# Altium integrated library Weidmueller_OMNIMATE_Power.IntLib: 508 symbols (part 7 of 9)
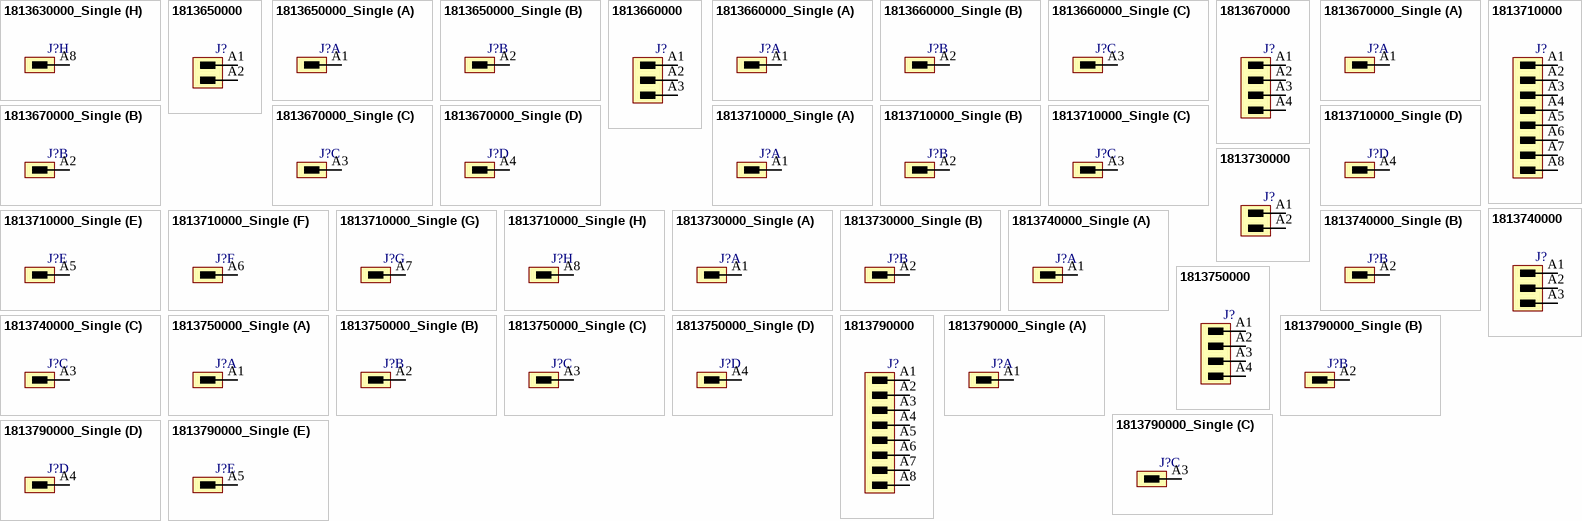
[diagram p37: symbols 1813630000_Single to 1813790000_Single]

## 1813650000_Single
designator J?
OMNIMATE Power - series BU/SU 10.16HP; PartNumber: 1813650000; Manufacturer: Weidmueller; Short_text_for_material: SU 10.16HP/02/180F 3.5AG BK BX; Side_termination_characteristic: Clip-on flange; Mounting_onto_the_PCB: Solder connection; Pitch_mm: 10.16 mm; Pitch_inch: 0.4 inch; No_of_poles: 2; Outgoing_elbow: 180°; Solder_pin_length_mm: 3.5 mm; Contact_material: Cu-Leg; Contact_surface: silver-plated; Insulating_material: PBT GF; UL_94_flammability_rating: V-0; Rated_voltage_for_surge_voltage_class_pollution_degree_II_2: 1000 V; Rated_current_min_no_of_poles_TU_20_deg_C: 19 A; Rated_voltage_use_group_B_UL_1059: 300 V; Rated_current_use_group_B_UL_1059: 54 A; PackageReference: SU_10_16HP_180F_02; Colour: Black; Packaging: Box; Qty: 50 PCS; Revision: V1; ComponentLink1Description: Manufacturer URL; ComponentLink1URL: http://www.weidmueller.com/; ComponentLink2Description: URL Link1; ComponentLink2URL: http://catalog.weidmueller.com/catalog/Start.do?localeId=en&ObjectID=1813650000
footprint SU_10_16HP_180F_02 (OMNIMATE Power - Serie BU/SU 10.16HP  SU 10.16HP/02/180F 3.5)
part A pins: A1
part B pins: A2

## 1813660000
designator J?
OMNIMATE Power - series BU/SU 10.16HP; PartNumber: 1813660000; Manufacturer: Weidmueller; Short_text_for_material: SU 10.16HP/03/180F 3.5AG BK BX; Side_termination_characteristic: Clip-on flange; Mounting_onto_the_PCB: Solder connection; Pitch_mm: 10.16 mm; Pitch_inch: 0.4 inch; No_of_poles: 3; Outgoing_elbow: 180°; Solder_pin_length_mm: 3.5 mm; Contact_material: Cu-Leg; Contact_surface: silver-plated; Insulating_material: PBT GF; UL_94_flammability_rating: V-0; Rated_voltage_for_surge_voltage_class_pollution_degree_II_2: 1000 V; Rated_current_min_no_of_poles_TU_20_deg_C: 19 A; Rated_voltage_use_group_B_UL_1059: 300 V; Rated_current_use_group_B_UL_1059: 54 A; PackageReference: SU_10_16HP_180F_03; Colour: Black; Packaging: Box; Qty: 50 PCS; Revision: V1; ComponentLink1Description: Manufacturer URL; ComponentLink1URL: http://www.weidmueller.com/; ComponentLink2Description: URL Link1; ComponentLink2URL: http://catalog.weidmueller.com/catalog/Start.do?localeId=en&ObjectID=1813660000
footprint SU_10_16HP_180F_03 (OMNIMATE Power - Serie BU/SU 10.16HP  SU 10.16HP/03/180F 3.5)
pins: A1, A2, A3

## 1813660000_Single
designator J?
OMNIMATE Power - series BU/SU 10.16HP; PartNumber: 1813660000; Manufacturer: Weidmueller; Short_text_for_material: SU 10.16HP/03/180F 3.5AG BK BX; Side_termination_characteristic: Clip-on flange; Mounting_onto_the_PCB: Solder connection; Pitch_mm: 10.16 mm; Pitch_inch: 0.4 inch; No_of_poles: 3; Outgoing_elbow: 180°; Solder_pin_length_mm: 3.5 mm; Contact_material: Cu-Leg; Contact_surface: silver-plated; Insulating_material: PBT GF; UL_94_flammability_rating: V-0; Rated_voltage_for_surge_voltage_class_pollution_degree_II_2: 1000 V; Rated_current_min_no_of_poles_TU_20_deg_C: 19 A; Rated_voltage_use_group_B_UL_1059: 300 V; Rated_current_use_group_B_UL_1059: 54 A; PackageReference: SU_10_16HP_180F_03; Colour: Black; Packaging: Box; Qty: 50 PCS; Revision: V1; ComponentLink1Description: Manufacturer URL; ComponentLink1URL: http://www.weidmueller.com/; ComponentLink2Description: URL Link1; ComponentLink2URL: http://catalog.weidmueller.com/catalog/Start.do?localeId=en&ObjectID=1813660000
footprint SU_10_16HP_180F_03 (OMNIMATE Power - Serie BU/SU 10.16HP  SU 10.16HP/03/180F 3.5)
part A pins: A1
part B pins: A2
part C pins: A3

## 1813670000
designator J?
OMNIMATE Power - series BU/SU 10.16HP; PartNumber: 1813670000; Manufacturer: Weidmueller; Short_text_for_material: SU 10.16HP/04/180F 3.5AG BK BX; Side_termination_characteristic: Clip-on flange; Mounting_onto_the_PCB: Solder connection; Pitch_mm: 10.16 mm; Pitch_inch: 0.4 inch; No_of_poles: 4; Outgoing_elbow: 180°; Solder_pin_length_mm: 3.5 mm; Contact_material: Cu-Leg; Contact_surface: silver-plated; Insulating_material: PBT GF; UL_94_flammability_rating: V-0; Rated_voltage_for_surge_voltage_class_pollution_degree_II_2: 1000 V; Rated_current_min_no_of_poles_TU_20_deg_C: 19 A; Rated_voltage_use_group_B_UL_1059: 300 V; Rated_current_use_group_B_UL_1059: 54 A; PackageReference: SU_10_16HP_180F_04; Colour: Black; Packaging: Box; Qty: 50 PCS; Revision: V1; ComponentLink1Description: Manufacturer URL; ComponentLink1URL: http://www.weidmueller.com/; ComponentLink2Description: URL Link1; ComponentLink2URL: http://catalog.weidmueller.com/catalog/Start.do?localeId=en&ObjectID=1813670000
footprint SU_10_16HP_180F_04 (OMNIMATE Power - Serie BU/SU 10.16HP  SU 10.16HP/04/180F 3.5)
pins: A1, A2, A3, A4

## 1813670000_Single
designator J?
OMNIMATE Power - series BU/SU 10.16HP; PartNumber: 1813670000; Manufacturer: Weidmueller; Short_text_for_material: SU 10.16HP/04/180F 3.5AG BK BX; Side_termination_characteristic: Clip-on flange; Mounting_onto_the_PCB: Solder connection; Pitch_mm: 10.16 mm; Pitch_inch: 0.4 inch; No_of_poles: 4; Outgoing_elbow: 180°; Solder_pin_length_mm: 3.5 mm; Contact_material: Cu-Leg; Contact_surface: silver-plated; Insulating_material: PBT GF; UL_94_flammability_rating: V-0; Rated_voltage_for_surge_voltage_class_pollution_degree_II_2: 1000 V; Rated_current_min_no_of_poles_TU_20_deg_C: 19 A; Rated_voltage_use_group_B_UL_1059: 300 V; Rated_current_use_group_B_UL_1059: 54 A; PackageReference: SU_10_16HP_180F_04; Colour: Black; Packaging: Box; Qty: 50 PCS; Revision: V1; ComponentLink1Description: Manufacturer URL; ComponentLink1URL: http://www.weidmueller.com/; ComponentLink2Description: URL Link1; ComponentLink2URL: http://catalog.weidmueller.com/catalog/Start.do?localeId=en&ObjectID=1813670000
footprint SU_10_16HP_180F_04 (OMNIMATE Power - Serie BU/SU 10.16HP  SU 10.16HP/04/180F 3.5)
part A pins: A1
part B pins: A2
part C pins: A3
part D pins: A4

## 1813710000
designator J?
OMNIMATE Power - series BU/SU 10.16HP; PartNumber: 1813710000; Manufacturer: Weidmueller; Short_text_for_material: SU 10.16HP/08/180F 3.5AG BK BX; Side_termination_characteristic: Clip-on flange; Mounting_onto_the_PCB: Solder connection; Pitch_mm: 10.16 mm; Pitch_inch: 0.4 inch; No_of_poles: 8; Outgoing_elbow: 180°; Solder_pin_length_mm: 3.5 mm; Contact_material: Cu-Leg; Contact_surface: silver-plated; Insulating_material: PBT GF; UL_94_flammability_rating: V-0; Rated_voltage_for_surge_voltage_class_pollution_degree_II_2: 1000 V; Rated_current_min_no_of_poles_TU_20_deg_C: 19 A; Rated_voltage_use_group_B_UL_1059: 300 V; Rated_current_use_group_B_UL_1059: 54 A; PackageReference: SU_10_16HP_180F_08; Colour: Black; Packaging: Box; Qty: 20 PCS; Revision: V1; ComponentLink1Description: Manufacturer URL; ComponentLink1URL: http://www.weidmueller.com/; ComponentLink2Description: URL Link1; ComponentLink2URL: http://catalog.weidmueller.com/catalog/Start.do?localeId=en&ObjectID=1813710000
footprint SU_10_16HP_180F_08 (OMNIMATE Power - Serie BU/SU 10.16HP  SU 10.16HP/08/180F 3.5)
pins: A1, A2, A3, A4, A5, A6, A7, A8

## 1813710000_Single
designator J?
OMNIMATE Power - series BU/SU 10.16HP; PartNumber: 1813710000; Manufacturer: Weidmueller; Short_text_for_material: SU 10.16HP/08/180F 3.5AG BK BX; Side_termination_characteristic: Clip-on flange; Mounting_onto_the_PCB: Solder connection; Pitch_mm: 10.16 mm; Pitch_inch: 0.4 inch; No_of_poles: 8; Outgoing_elbow: 180°; Solder_pin_length_mm: 3.5 mm; Contact_material: Cu-Leg; Contact_surface: silver-plated; Insulating_material: PBT GF; UL_94_flammability_rating: V-0; Rated_voltage_for_surge_voltage_class_pollution_degree_II_2: 1000 V; Rated_current_min_no_of_poles_TU_20_deg_C: 19 A; Rated_voltage_use_group_B_UL_1059: 300 V; Rated_current_use_group_B_UL_1059: 54 A; PackageReference: SU_10_16HP_180F_08; Colour: Black; Packaging: Box; Qty: 20 PCS; Revision: V1; ComponentLink1Description: Manufacturer URL; ComponentLink1URL: http://www.weidmueller.com/; ComponentLink2Description: URL Link1; ComponentLink2URL: http://catalog.weidmueller.com/catalog/Start.do?localeId=en&ObjectID=1813710000
footprint SU_10_16HP_180F_08 (OMNIMATE Power - Serie BU/SU 10.16HP  SU 10.16HP/08/180F 3.5)
part A pins: A1
part B pins: A2
part C pins: A3
part D pins: A4
part E pins: A5
part F pins: A6
part G pins: A7
part H pins: A8

## 1813730000
designator J?
OMNIMATE Power - series BU/SU 10.16HP; PartNumber: 1813730000; Manufacturer: Weidmueller; Short_text_for_material: SU 10.16HP/02/270F 3.5AG BK BX; Side_termination_characteristic: Clip-on flange; Mounting_onto_the_PCB: Solder connection; Pitch_mm: 10.16 mm; Pitch_inch: 0.4 inch; No_of_poles: 2; Outgoing_elbow: 270°; Solder_pin_length_mm: 3.5 mm; Contact_material: Cu-Leg; Contact_surface: silver-plated; Insulating_material: PBT GF; UL_94_flammability_rating: V-0; Rated_voltage_for_surge_voltage_class_pollution_degree_II_2: 1000 V; Rated_current_min_no_of_poles_TU_20_deg_C: 19 A; Rated_voltage_use_group_B_UL_1059: 300 V; Rated_current_use_group_B_UL_1059: 54 A; PackageReference: SU_10_16HP_270F_02; Colour: Black; Packaging: Box; Qty: 50 PCS; Revision: V1; ComponentLink1Description: Manufacturer URL; ComponentLink1URL: http://www.weidmueller.com/; ComponentLink2Description: URL Link1; ComponentLink2URL: http://catalog.weidmueller.com/catalog/Start.do?localeId=en&ObjectID=1813730000
footprint SU_10_16HP_270F_02 (OMNIMATE Power - Serie BU/SU 10.16HP  SU 10.16HP/02/270F 3.5)
pins: A1, A2

## 1813730000_Single
designator J?
OMNIMATE Power - series BU/SU 10.16HP; PartNumber: 1813730000; Manufacturer: Weidmueller; Short_text_for_material: SU 10.16HP/02/270F 3.5AG BK BX; Side_termination_characteristic: Clip-on flange; Mounting_onto_the_PCB: Solder connection; Pitch_mm: 10.16 mm; Pitch_inch: 0.4 inch; No_of_poles: 2; Outgoing_elbow: 270°; Solder_pin_length_mm: 3.5 mm; Contact_material: Cu-Leg; Contact_surface: silver-plated; Insulating_material: PBT GF; UL_94_flammability_rating: V-0; Rated_voltage_for_surge_voltage_class_pollution_degree_II_2: 1000 V; Rated_current_min_no_of_poles_TU_20_deg_C: 19 A; Rated_voltage_use_group_B_UL_1059: 300 V; Rated_current_use_group_B_UL_1059: 54 A; PackageReference: SU_10_16HP_270F_02; Colour: Black; Packaging: Box; Qty: 50 PCS; Revision: V1; ComponentLink1Description: Manufacturer URL; ComponentLink1URL: http://www.weidmueller.com/; ComponentLink2Description: URL Link1; ComponentLink2URL: http://catalog.weidmueller.com/catalog/Start.do?localeId=en&ObjectID=1813730000
footprint SU_10_16HP_270F_02 (OMNIMATE Power - Serie BU/SU 10.16HP  SU 10.16HP/02/270F 3.5)
part A pins: A1
part B pins: A2

## 1813740000
designator J?
OMNIMATE Power - series BU/SU 10.16HP; PartNumber: 1813740000; Manufacturer: Weidmueller; Short_text_for_material: SU 10.16HP/03/270F 3.5AG BK BX; Side_termination_characteristic: Clip-on flange; Mounting_onto_the_PCB: Solder connection; Pitch_mm: 10.16 mm; Pitch_inch: 0.4 inch; No_of_poles: 3; Outgoing_elbow: 270°; Solder_pin_length_mm: 3.5 mm; Contact_material: Cu-Leg; Contact_surface: silver-plated; Insulating_material: PBT GF; UL_94_flammability_rating: V-0; Rated_voltage_for_surge_voltage_class_pollution_degree_II_2: 1000 V; Rated_current_min_no_of_poles_TU_20_deg_C: 19 A; Rated_voltage_use_group_B_UL_1059: 300 V; Rated_current_use_group_B_UL_1059: 54 A; PackageReference: SU_10_16HP_270F_03; Colour: Black; Packaging: Box; Qty: 50 PCS; Revision: V1; ComponentLink1Description: Manufacturer URL; ComponentLink1URL: http://www.weidmueller.com/; ComponentLink2Description: URL Link1; ComponentLink2URL: http://catalog.weidmueller.com/catalog/Start.do?localeId=en&ObjectID=1813740000
footprint SU_10_16HP_270F_03 (OMNIMATE Power - Serie BU/SU 10.16HP  SU 10.16HP/03/270F 3.5)
pins: A1, A2, A3

## 1813740000_Single
designator J?
OMNIMATE Power - series BU/SU 10.16HP; PartNumber: 1813740000; Manufacturer: Weidmueller; Short_text_for_material: SU 10.16HP/03/270F 3.5AG BK BX; Side_termination_characteristic: Clip-on flange; Mounting_onto_the_PCB: Solder connection; Pitch_mm: 10.16 mm; Pitch_inch: 0.4 inch; No_of_poles: 3; Outgoing_elbow: 270°; Solder_pin_length_mm: 3.5 mm; Contact_material: Cu-Leg; Contact_surface: silver-plated; Insulating_material: PBT GF; UL_94_flammability_rating: V-0; Rated_voltage_for_surge_voltage_class_pollution_degree_II_2: 1000 V; Rated_current_min_no_of_poles_TU_20_deg_C: 19 A; Rated_voltage_use_group_B_UL_1059: 300 V; Rated_current_use_group_B_UL_1059: 54 A; PackageReference: SU_10_16HP_270F_03; Colour: Black; Packaging: Box; Qty: 50 PCS; Revision: V1; ComponentLink1Description: Manufacturer URL; ComponentLink1URL: http://www.weidmueller.com/; ComponentLink2Description: URL Link1; ComponentLink2URL: http://catalog.weidmueller.com/catalog/Start.do?localeId=en&ObjectID=1813740000
footprint SU_10_16HP_270F_03 (OMNIMATE Power - Serie BU/SU 10.16HP  SU 10.16HP/03/270F 3.5)
part A pins: A1
part B pins: A2
part C pins: A3

## 1813750000
designator J?
OMNIMATE Power - series BU/SU 10.16HP; PartNumber: 1813750000; Manufacturer: Weidmueller; Short_text_for_material: SU 10.16HP/04/270F 3.5AG BK BX; Side_termination_characteristic: Clip-on flange; Mounting_onto_the_PCB: Solder connection; Pitch_mm: 10.16 mm; Pitch_inch: 0.4 inch; No_of_poles: 4; Outgoing_elbow: 270°; Solder_pin_length_mm: 3.5 mm; Contact_material: Cu-Leg; Contact_surface: silver-plated; Insulating_material: PBT GF; UL_94_flammability_rating: V-0; Rated_voltage_for_surge_voltage_class_pollution_degree_II_2: 1000 V; Rated_current_min_no_of_poles_TU_20_deg_C: 19 A; Rated_voltage_use_group_B_UL_1059: 300 V; Rated_current_use_group_B_UL_1059: 54 A; PackageReference: SU_10_16HP_270F_04; Colour: Black; Packaging: Box; Qty: 50 PCS; Revision: V1; ComponentLink1Description: Manufacturer URL; ComponentLink1URL: http://www.weidmueller.com/; ComponentLink2Description: URL Link1; ComponentLink2URL: http://catalog.weidmueller.com/catalog/Start.do?localeId=en&ObjectID=1813750000
footprint SU_10_16HP_270F_04 (OMNIMATE Power - Serie BU/SU 10.16HP  SU 10.16HP/04/270F 3.5)
pins: A1, A2, A3, A4

## 1813750000_Single
designator J?
OMNIMATE Power - series BU/SU 10.16HP; PartNumber: 1813750000; Manufacturer: Weidmueller; Short_text_for_material: SU 10.16HP/04/270F 3.5AG BK BX; Side_termination_characteristic: Clip-on flange; Mounting_onto_the_PCB: Solder connection; Pitch_mm: 10.16 mm; Pitch_inch: 0.4 inch; No_of_poles: 4; Outgoing_elbow: 270°; Solder_pin_length_mm: 3.5 mm; Contact_material: Cu-Leg; Contact_surface: silver-plated; Insulating_material: PBT GF; UL_94_flammability_rating: V-0; Rated_voltage_for_surge_voltage_class_pollution_degree_II_2: 1000 V; Rated_current_min_no_of_poles_TU_20_deg_C: 19 A; Rated_voltage_use_group_B_UL_1059: 300 V; Rated_current_use_group_B_UL_1059: 54 A; PackageReference: SU_10_16HP_270F_04; Colour: Black; Packaging: Box; Qty: 50 PCS; Revision: V1; ComponentLink1Description: Manufacturer URL; ComponentLink1URL: http://www.weidmueller.com/; ComponentLink2Description: URL Link1; ComponentLink2URL: http://catalog.weidmueller.com/catalog/Start.do?localeId=en&ObjectID=1813750000
footprint SU_10_16HP_270F_04 (OMNIMATE Power - Serie BU/SU 10.16HP  SU 10.16HP/04/270F 3.5)
part A pins: A1
part B pins: A2
part C pins: A3
part D pins: A4

## 1813790000
designator J?
OMNIMATE Power - series BU/SU 10.16HP; PartNumber: 1813790000; Manufacturer: Weidmueller; Short_text_for_material: SU 10.16HP/08/270F 3.5AG BK BX; Side_termination_characteristic: Clip-on flange; Mounting_onto_the_PCB: Solder connection; Pitch_mm: 10.16 mm; Pitch_inch: 0.4 inch; No_of_poles: 8; Outgoing_elbow: 270°; Solder_pin_length_mm: 3.5 mm; Contact_material: Cu-Leg; Contact_surface: silver-plated; Insulating_material: PBT GF; UL_94_flammability_rating: V-0; Rated_voltage_for_surge_voltage_class_pollution_degree_II_2: 1000 V; Rated_current_min_no_of_poles_TU_20_deg_C: 19 A; Rated_voltage_use_group_B_UL_1059: 300 V; Rated_current_use_group_B_UL_1059: 54 A; PackageReference: SU_10_16HP_270F_08; Colour: Black; Packaging: Box; Qty: 20 PCS; Revision: V1; ComponentLink1Description: Manufacturer URL; ComponentLink1URL: http://www.weidmueller.com/; ComponentLink2Description: URL Link1; ComponentLink2URL: http://catalog.weidmueller.com/catalog/Start.do?localeId=en&ObjectID=1813790000
footprint SU_10_16HP_270F_08 (OMNIMATE Power - Serie BU/SU 10.16HP  SU 10.16HP/08/270F 3.5)
pins: A1, A2, A3, A4, A5, A6, A7, A8

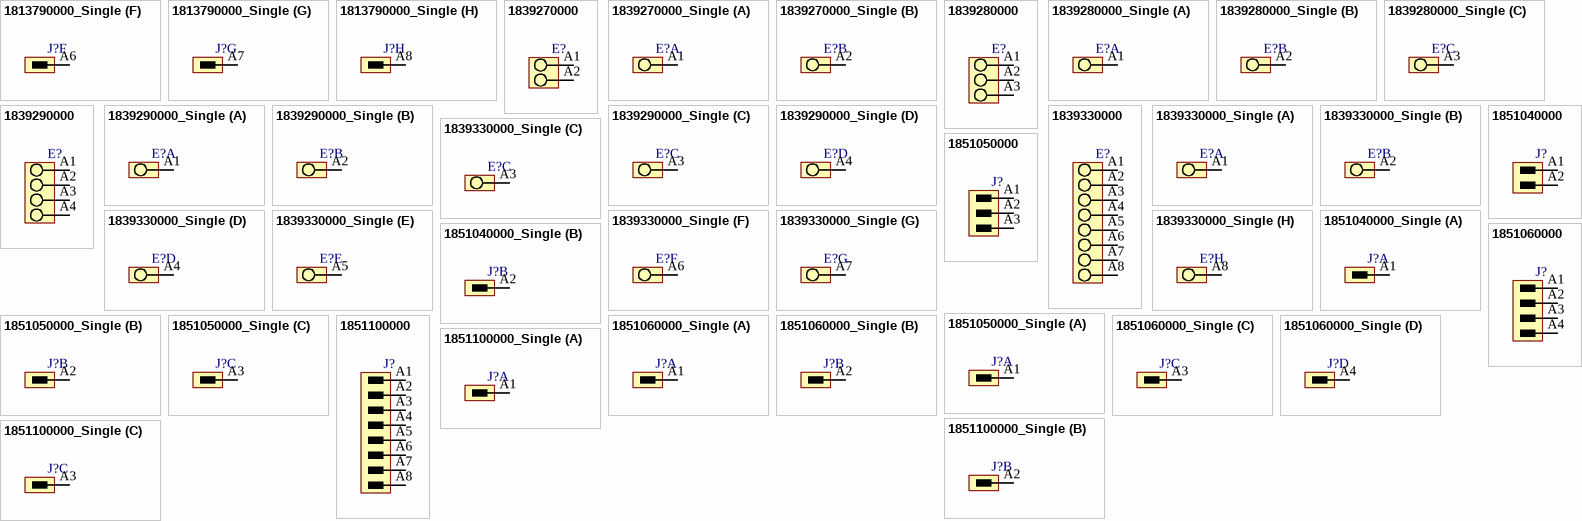
[diagram p24: symbols 1813790000_Single to 1851100000_Single]

## 1813790000_Single
designator J?
OMNIMATE Power - series BU/SU 10.16HP; PartNumber: 1813790000; Manufacturer: Weidmueller; Short_text_for_material: SU 10.16HP/08/270F 3.5AG BK BX; Side_termination_characteristic: Clip-on flange; Mounting_onto_the_PCB: Solder connection; Pitch_mm: 10.16 mm; Pitch_inch: 0.4 inch; No_of_poles: 8; Outgoing_elbow: 270°; Solder_pin_length_mm: 3.5 mm; Contact_material: Cu-Leg; Contact_surface: silver-plated; Insulating_material: PBT GF; UL_94_flammability_rating: V-0; Rated_voltage_for_surge_voltage_class_pollution_degree_II_2: 1000 V; Rated_current_min_no_of_poles_TU_20_deg_C: 19 A; Rated_voltage_use_group_B_UL_1059: 300 V; Rated_current_use_group_B_UL_1059: 54 A; PackageReference: SU_10_16HP_270F_08; Colour: Black; Packaging: Box; Qty: 20 PCS; Revision: V1; ComponentLink1Description: Manufacturer URL; ComponentLink1URL: http://www.weidmueller.com/; ComponentLink2Description: URL Link1; ComponentLink2URL: http://catalog.weidmueller.com/catalog/Start.do?localeId=en&ObjectID=1813790000
footprint SU_10_16HP_270F_08 (OMNIMATE Power - Serie BU/SU 10.16HP  SU 10.16HP/08/270F 3.5)
part A pins: A1
part B pins: A2
part C pins: A3
part D pins: A4
part E pins: A5
part F pins: A6
part G pins: A7
part H pins: A8

## 1839270000
designator E?
OMNIMATE Power - series LUP; PartNumber: 1839270000; Manufacturer: Weidmueller; Short_text_for_material: LUP 10.16/02/90 3.2SN GY BX; Side_termination_characteristic: closed side; Mounting_onto_the_PCB: Solder connection; Pitch_mm: 10,16 mm; Pitch_inch: 0,4 inch; No_of_poles: 2; Solder_pin_length_mm: 3,2 mm; Contact_material: E-Cu; Contact_surface: tinned; Insulating_material: Wemid (PA); UL_94_flammability_rating: V-0; Rated_voltage_for_surge_voltage_class_pollution_degree_II_2: 1000 V; Rated_current_min_no_of_poles_TU_20_deg_C: 76 A; Solid_min_H05_07_V_U: 0,5 mm²; Solid_max_H05_07_V_U: 16 mm²; Rated_voltage_use_group_B_UL_1059: 300 V; Rated_current_use_group_B_UL_1059: 58 A; Wire_cross_section_AWG_min_UL_1059: AWG 26; Wire_cross_section_AWG_max_UL_1059: AWG 6; PackageReference: LUP_10_16_90_02; Colour: Pebble grey; Packaging: Box; Qty: 20 PCS; Revision: V1; ComponentLink1Description: Manufacturer URL; ComponentLink1URL: http://www.weidmueller.com/; ComponentLink2Description: URL Link1; ComponentLink2URL: http://catalog.weidmueller.com/catalog/Start.do?localeId=en&ObjectID=1839270000
footprint LUP_10_16_90_02 (OMNIMATE Power - Serie LUP  LUP 10.16/02/90 3.2)
pins: A1, A2
1 alternate drawing of the same symbol

## 1839270000_Single
designator E?
OMNIMATE Power - series LUP; PartNumber: 1839270000; Manufacturer: Weidmueller; Short_text_for_material: LUP 10.16/02/90 3.2SN GY BX; Side_termination_characteristic: closed side; Mounting_onto_the_PCB: Solder connection; Pitch_mm: 10,16 mm; Pitch_inch: 0,4 inch; No_of_poles: 2; Solder_pin_length_mm: 3,2 mm; Contact_material: E-Cu; Contact_surface: tinned; Insulating_material: Wemid (PA); UL_94_flammability_rating: V-0; Rated_voltage_for_surge_voltage_class_pollution_degree_II_2: 1000 V; Rated_current_min_no_of_poles_TU_20_deg_C: 76 A; Solid_min_H05_07_V_U: 0,5 mm²; Solid_max_H05_07_V_U: 16 mm²; Rated_voltage_use_group_B_UL_1059: 300 V; Rated_current_use_group_B_UL_1059: 58 A; Wire_cross_section_AWG_min_UL_1059: AWG 26; Wire_cross_section_AWG_max_UL_1059: AWG 6; PackageReference: LUP_10_16_90_02; Colour: Pebble grey; Packaging: Box; Qty: 20 PCS; Revision: V1; ComponentLink1Description: Manufacturer URL; ComponentLink1URL: http://www.weidmueller.com/; ComponentLink2Description: URL Link1; ComponentLink2URL: http://catalog.weidmueller.com/catalog/Start.do?localeId=en&ObjectID=1839270000
footprint LUP_10_16_90_02 (OMNIMATE Power - Serie LUP  LUP 10.16/02/90 3.2)
part A pins: A1
part B pins: A2
1 alternate drawing of the same symbol

## 1839280000
designator E?
OMNIMATE Power - series LUP; PartNumber: 1839280000; Manufacturer: Weidmueller; Short_text_for_material: LUP 10.16/03/90 3.2SN GY BX; Side_termination_characteristic: closed side; Mounting_onto_the_PCB: Solder connection; Pitch_mm: 10,16 mm; Pitch_inch: 0,4 inch; No_of_poles: 3; Solder_pin_length_mm: 3,2 mm; Contact_material: E-Cu; Contact_surface: tinned; Insulating_material: Wemid (PA); UL_94_flammability_rating: V-0; Rated_voltage_for_surge_voltage_class_pollution_degree_II_2: 1000 V; Rated_current_min_no_of_poles_TU_20_deg_C: 76 A; Solid_min_H05_07_V_U: 0,5 mm²; Solid_max_H05_07_V_U: 16 mm²; Rated_voltage_use_group_B_UL_1059: 300 V; Rated_current_use_group_B_UL_1059: 58 A; Wire_cross_section_AWG_min_UL_1059: AWG 26; Wire_cross_section_AWG_max_UL_1059: AWG 6; PackageReference: LUP_10_16_90_03; Colour: Pebble grey; Packaging: Box; Qty: 20 PCS; Revision: V1; ComponentLink1Description: Manufacturer URL; ComponentLink1URL: http://www.weidmueller.com/; ComponentLink2Description: URL Link1; ComponentLink2URL: http://catalog.weidmueller.com/catalog/Start.do?localeId=en&ObjectID=1839280000
footprint LUP_10_16_90_03 (OMNIMATE Power - Serie LUP  LUP 10.16/03/90 3.2)
pins: A1, A2, A3
1 alternate drawing of the same symbol

## 1839280000_Single
designator E?
OMNIMATE Power - series LUP; PartNumber: 1839280000; Manufacturer: Weidmueller; Short_text_for_material: LUP 10.16/03/90 3.2SN GY BX; Side_termination_characteristic: closed side; Mounting_onto_the_PCB: Solder connection; Pitch_mm: 10,16 mm; Pitch_inch: 0,4 inch; No_of_poles: 3; Solder_pin_length_mm: 3,2 mm; Contact_material: E-Cu; Contact_surface: tinned; Insulating_material: Wemid (PA); UL_94_flammability_rating: V-0; Rated_voltage_for_surge_voltage_class_pollution_degree_II_2: 1000 V; Rated_current_min_no_of_poles_TU_20_deg_C: 76 A; Solid_min_H05_07_V_U: 0,5 mm²; Solid_max_H05_07_V_U: 16 mm²; Rated_voltage_use_group_B_UL_1059: 300 V; Rated_current_use_group_B_UL_1059: 58 A; Wire_cross_section_AWG_min_UL_1059: AWG 26; Wire_cross_section_AWG_max_UL_1059: AWG 6; PackageReference: LUP_10_16_90_03; Colour: Pebble grey; Packaging: Box; Qty: 20 PCS; Revision: V1; ComponentLink1Description: Manufacturer URL; ComponentLink1URL: http://www.weidmueller.com/; ComponentLink2Description: URL Link1; ComponentLink2URL: http://catalog.weidmueller.com/catalog/Start.do?localeId=en&ObjectID=1839280000
footprint LUP_10_16_90_03 (OMNIMATE Power - Serie LUP  LUP 10.16/03/90 3.2)
part A pins: A1
part B pins: A2
part C pins: A3
1 alternate drawing of the same symbol

## 1839290000
designator E?
OMNIMATE Power - series LUP; PartNumber: 1839290000; Manufacturer: Weidmueller; Short_text_for_material: LUP 10.16/04/90 3.2SN GY BX; Side_termination_characteristic: closed side; Mounting_onto_the_PCB: Solder connection; Pitch_mm: 10,16 mm; Pitch_inch: 0,4 inch; No_of_poles: 4; Solder_pin_length_mm: 3,2 mm; Contact_material: E-Cu; Contact_surface: tinned; Insulating_material: Wemid (PA); UL_94_flammability_rating: V-0; Rated_voltage_for_surge_voltage_class_pollution_degree_II_2: 1000 V; Rated_current_min_no_of_poles_TU_20_deg_C: 76 A; Solid_min_H05_07_V_U: 0,5 mm²; Solid_max_H05_07_V_U: 16 mm²; Rated_voltage_use_group_B_UL_1059: 300 V; Rated_current_use_group_B_UL_1059: 58 A; Wire_cross_section_AWG_min_UL_1059: AWG 26; Wire_cross_section_AWG_max_UL_1059: AWG 6; PackageReference: LUP_10_16_90_04; Colour: Pebble grey; Packaging: Box; Qty: 20 PCS; Revision: V1; ComponentLink1Description: Manufacturer URL; ComponentLink1URL: http://www.weidmueller.com/; ComponentLink2Description: URL Link1; ComponentLink2URL: http://catalog.weidmueller.com/catalog/Start.do?localeId=en&ObjectID=1839290000
footprint LUP_10_16_90_04 (OMNIMATE Power - Serie LUP  LUP 10.16/04/90 3.2)
pins: A1, A2, A3, A4
1 alternate drawing of the same symbol

## 1839290000_Single
designator E?
OMNIMATE Power - series LUP; PartNumber: 1839290000; Manufacturer: Weidmueller; Short_text_for_material: LUP 10.16/04/90 3.2SN GY BX; Side_termination_characteristic: closed side; Mounting_onto_the_PCB: Solder connection; Pitch_mm: 10,16 mm; Pitch_inch: 0,4 inch; No_of_poles: 4; Solder_pin_length_mm: 3,2 mm; Contact_material: E-Cu; Contact_surface: tinned; Insulating_material: Wemid (PA); UL_94_flammability_rating: V-0; Rated_voltage_for_surge_voltage_class_pollution_degree_II_2: 1000 V; Rated_current_min_no_of_poles_TU_20_deg_C: 76 A; Solid_min_H05_07_V_U: 0,5 mm²; Solid_max_H05_07_V_U: 16 mm²; Rated_voltage_use_group_B_UL_1059: 300 V; Rated_current_use_group_B_UL_1059: 58 A; Wire_cross_section_AWG_min_UL_1059: AWG 26; Wire_cross_section_AWG_max_UL_1059: AWG 6; PackageReference: LUP_10_16_90_04; Colour: Pebble grey; Packaging: Box; Qty: 20 PCS; Revision: V1; ComponentLink1Description: Manufacturer URL; ComponentLink1URL: http://www.weidmueller.com/; ComponentLink2Description: URL Link1; ComponentLink2URL: http://catalog.weidmueller.com/catalog/Start.do?localeId=en&ObjectID=1839290000
footprint LUP_10_16_90_04 (OMNIMATE Power - Serie LUP  LUP 10.16/04/90 3.2)
part A pins: A1
part B pins: A2
part C pins: A3
part D pins: A4
1 alternate drawing of the same symbol

## 1839330000
designator E?
OMNIMATE Power - series LUP; PartNumber: 1839330000; Manufacturer: Weidmueller; Short_text_for_material: LUP 10.16/08/90 3.2SN GY BX; Side_termination_characteristic: closed side; Mounting_onto_the_PCB: Solder connection; Pitch_mm: 10,16 mm; Pitch_inch: 0,4 inch; No_of_poles: 8; Solder_pin_length_mm: 3,2 mm; Contact_material: E-Cu; Contact_surface: tinned; Insulating_material: Wemid (PA); UL_94_flammability_rating: V-0; Rated_voltage_for_surge_voltage_class_pollution_degree_II_2: 1000 V; Rated_current_min_no_of_poles_TU_20_deg_C: 76 A; Solid_min_H05_07_V_U: 0,5 mm²; Solid_max_H05_07_V_U: 16 mm²; Rated_voltage_use_group_B_UL_1059: 300 V; Rated_current_use_group_B_UL_1059: 58 A; Wire_cross_section_AWG_min_UL_1059: AWG 26; Wire_cross_section_AWG_max_UL_1059: AWG 6; PackageReference: LUP_10_16_90_08; Colour: Pebble grey; Packaging: Box; Qty: 20 PCS; Revision: V1; ComponentLink1Description: Manufacturer URL; ComponentLink1URL: http://www.weidmueller.com/; ComponentLink2Description: URL Link1; ComponentLink2URL: http://catalog.weidmueller.com/catalog/Start.do?localeId=en&ObjectID=1839330000
footprint LUP_10_16_90_08 (OMNIMATE Power - Serie LUP  LUP 10.16/08/90 3.2)
pins: A1, A2, A3, A4, A5, A6, A7, A8
1 alternate drawing of the same symbol

## 1839330000_Single
designator E?
OMNIMATE Power - series LUP; PartNumber: 1839330000; Manufacturer: Weidmueller; Short_text_for_material: LUP 10.16/08/90 3.2SN GY BX; Side_termination_characteristic: closed side; Mounting_onto_the_PCB: Solder connection; Pitch_mm: 10,16 mm; Pitch_inch: 0,4 inch; No_of_poles: 8; Solder_pin_length_mm: 3,2 mm; Contact_material: E-Cu; Contact_surface: tinned; Insulating_material: Wemid (PA); UL_94_flammability_rating: V-0; Rated_voltage_for_surge_voltage_class_pollution_degree_II_2: 1000 V; Rated_current_min_no_of_poles_TU_20_deg_C: 76 A; Solid_min_H05_07_V_U: 0,5 mm²; Solid_max_H05_07_V_U: 16 mm²; Rated_voltage_use_group_B_UL_1059: 300 V; Rated_current_use_group_B_UL_1059: 58 A; Wire_cross_section_AWG_min_UL_1059: AWG 26; Wire_cross_section_AWG_max_UL_1059: AWG 6; PackageReference: LUP_10_16_90_08; Colour: Pebble grey; Packaging: Box; Qty: 20 PCS; Revision: V1; ComponentLink1Description: Manufacturer URL; ComponentLink1URL: http://www.weidmueller.com/; ComponentLink2Description: URL Link1; ComponentLink2URL: http://catalog.weidmueller.com/catalog/Start.do?localeId=en&ObjectID=1839330000
footprint LUP_10_16_90_08 (OMNIMATE Power - Serie LUP  LUP 10.16/08/90 3.2)
part A pins: A1
part B pins: A2
part C pins: A3
part D pins: A4
part E pins: A5
part F pins: A6
part G pins: A7
part H pins: A8
1 alternate drawing of the same symbol

## 1851040000
designator J?
OMNIMATE Power - series BU/SU 10.16HP; PartNumber: 1851040000; Manufacturer: Weidmueller; Short_text_for_material: SU 10.16HP/02/90SF 3.5AG BK BX; Side_termination_characteristic: Screw/clip-on flange; Mounting_onto_the_PCB: Solder connection; Pitch_mm: 10.16 mm; Pitch_inch: 0.4 inch; No_of_poles: 2; Outgoing_elbow: 90°; Solder_pin_length_mm: 3.5 mm; Contact_material: Cu-Leg; Contact_surface: silver-plated; Insulating_material: PBT GF; UL_94_flammability_rating: V-0; Rated_voltage_for_surge_voltage_class_pollution_degree_II_2: 1000 V; Rated_current_min_no_of_poles_TU_20_deg_C: 19 A; Rated_voltage_use_group_B_UL_1059: 300 V; Rated_current_use_group_B_UL_1059: 54 A; PackageReference: SU_10_16HP_90SF_02; Colour: Black; Packaging: Box; Qty: 50 PCS; Revision: V1; ComponentLink1Description: Manufacturer URL; ComponentLink1URL: http://www.weidmueller.com/; ComponentLink2Description: URL Link1; ComponentLink2URL: http://catalog.weidmueller.com/catalog/Start.do?localeId=en&ObjectID=1851040000
footprint SU_10_16HP_90SF_02 (OMNIMATE Power - Serie BU/SU 10.16HP  SU 10.16HP/02/90SF 3.5)
pins: A1, A2

## 1851040000_Single
designator J?
OMNIMATE Power - series BU/SU 10.16HP; PartNumber: 1851040000; Manufacturer: Weidmueller; Short_text_for_material: SU 10.16HP/02/90SF 3.5AG BK BX; Side_termination_characteristic: Screw/clip-on flange; Mounting_onto_the_PCB: Solder connection; Pitch_mm: 10.16 mm; Pitch_inch: 0.4 inch; No_of_poles: 2; Outgoing_elbow: 90°; Solder_pin_length_mm: 3.5 mm; Contact_material: Cu-Leg; Contact_surface: silver-plated; Insulating_material: PBT GF; UL_94_flammability_rating: V-0; Rated_voltage_for_surge_voltage_class_pollution_degree_II_2: 1000 V; Rated_current_min_no_of_poles_TU_20_deg_C: 19 A; Rated_voltage_use_group_B_UL_1059: 300 V; Rated_current_use_group_B_UL_1059: 54 A; PackageReference: SU_10_16HP_90SF_02; Colour: Black; Packaging: Box; Qty: 50 PCS; Revision: V1; ComponentLink1Description: Manufacturer URL; ComponentLink1URL: http://www.weidmueller.com/; ComponentLink2Description: URL Link1; ComponentLink2URL: http://catalog.weidmueller.com/catalog/Start.do?localeId=en&ObjectID=1851040000
footprint SU_10_16HP_90SF_02 (OMNIMATE Power - Serie BU/SU 10.16HP  SU 10.16HP/02/90SF 3.5)
part A pins: A1
part B pins: A2

## 1851050000
designator J?
OMNIMATE Power - series BU/SU 10.16HP; PartNumber: 1851050000; Manufacturer: Weidmueller; Short_text_for_material: SU 10.16HP/03/90SF 3.5AG BK BX; Side_termination_characteristic: Screw/clip-on flange; Mounting_onto_the_PCB: Solder connection; Pitch_mm: 10.16 mm; Pitch_inch: 0.4 inch; No_of_poles: 3; Outgoing_elbow: 90°; Solder_pin_length_mm: 3.5 mm; Contact_material: Cu-Leg; Contact_surface: silver-plated; Insulating_material: PBT GF; UL_94_flammability_rating: V-0; Rated_voltage_for_surge_voltage_class_pollution_degree_II_2: 1000 V; Rated_current_min_no_of_poles_TU_20_deg_C: 19 A; Rated_voltage_use_group_B_UL_1059: 300 V; Rated_current_use_group_B_UL_1059: 54 A; PackageReference: SU_10_16HP_90SF_03; Colour: Black; Packaging: Box; Qty: 50 PCS; Revision: V1; ComponentLink1Description: Manufacturer URL; ComponentLink1URL: http://www.weidmueller.com/; ComponentLink2Description: URL Link1; ComponentLink2URL: http://catalog.weidmueller.com/catalog/Start.do?localeId=en&ObjectID=1851050000
footprint SU_10_16HP_90SF_03 (OMNIMATE Power - Serie BU/SU 10.16HP  SU 10.16HP/03/90SF 3.5)
pins: A1, A2, A3

## 1851050000_Single
designator J?
OMNIMATE Power - series BU/SU 10.16HP; PartNumber: 1851050000; Manufacturer: Weidmueller; Short_text_for_material: SU 10.16HP/03/90SF 3.5AG BK BX; Side_termination_characteristic: Screw/clip-on flange; Mounting_onto_the_PCB: Solder connection; Pitch_mm: 10.16 mm; Pitch_inch: 0.4 inch; No_of_poles: 3; Outgoing_elbow: 90°; Solder_pin_length_mm: 3.5 mm; Contact_material: Cu-Leg; Contact_surface: silver-plated; Insulating_material: PBT GF; UL_94_flammability_rating: V-0; Rated_voltage_for_surge_voltage_class_pollution_degree_II_2: 1000 V; Rated_current_min_no_of_poles_TU_20_deg_C: 19 A; Rated_voltage_use_group_B_UL_1059: 300 V; Rated_current_use_group_B_UL_1059: 54 A; PackageReference: SU_10_16HP_90SF_03; Colour: Black; Packaging: Box; Qty: 50 PCS; Revision: V1; ComponentLink1Description: Manufacturer URL; ComponentLink1URL: http://www.weidmueller.com/; ComponentLink2Description: URL Link1; ComponentLink2URL: http://catalog.weidmueller.com/catalog/Start.do?localeId=en&ObjectID=1851050000
footprint SU_10_16HP_90SF_03 (OMNIMATE Power - Serie BU/SU 10.16HP  SU 10.16HP/03/90SF 3.5)
part A pins: A1
part B pins: A2
part C pins: A3

## 1851060000
designator J?
OMNIMATE Power - series BU/SU 10.16HP; PartNumber: 1851060000; Manufacturer: Weidmueller; Short_text_for_material: SU 10.16HP/04/90SF 3.5AG BK BX; Side_termination_characteristic: Screw/clip-on flange; Mounting_onto_the_PCB: Solder connection; Pitch_mm: 10.16 mm; Pitch_inch: 0.4 inch; No_of_poles: 4; Outgoing_elbow: 90°; Solder_pin_length_mm: 3.5 mm; Contact_material: Cu-Leg; Contact_surface: silver-plated; Insulating_material: PBT GF; UL_94_flammability_rating: V-0; Rated_voltage_for_surge_voltage_class_pollution_degree_II_2: 1000 V; Rated_current_min_no_of_poles_TU_20_deg_C: 19 A; Rated_voltage_use_group_B_UL_1059: 300 V; Rated_current_use_group_B_UL_1059: 54 A; PackageReference: SU_10_16HP_90SF_04; Colour: Black; Packaging: Box; Qty: 50 PCS; Revision: V1; ComponentLink1Description: Manufacturer URL; ComponentLink1URL: http://www.weidmueller.com/; ComponentLink2Description: URL Link1; ComponentLink2URL: http://catalog.weidmueller.com/catalog/Start.do?localeId=en&ObjectID=1851060000
footprint SU_10_16HP_90SF_04 (OMNIMATE Power - Serie BU/SU 10.16HP  SU 10.16HP/04/90SF 3.5)
pins: A1, A2, A3, A4

## 1851060000_Single
designator J?